# Altium footprint library misc.PcbLib: 60 footprints (part 4 of 4)
Each footprint in its own frame and in the unit in brackets; x right, y up, seen from the top. Pads: shape width x height; smd on the part's side, far side on the other; paste and mask are expansions set on the pad; w line width, h text height; cw(c..) or ccw(c..) is an arc to the next point about the centre after c.
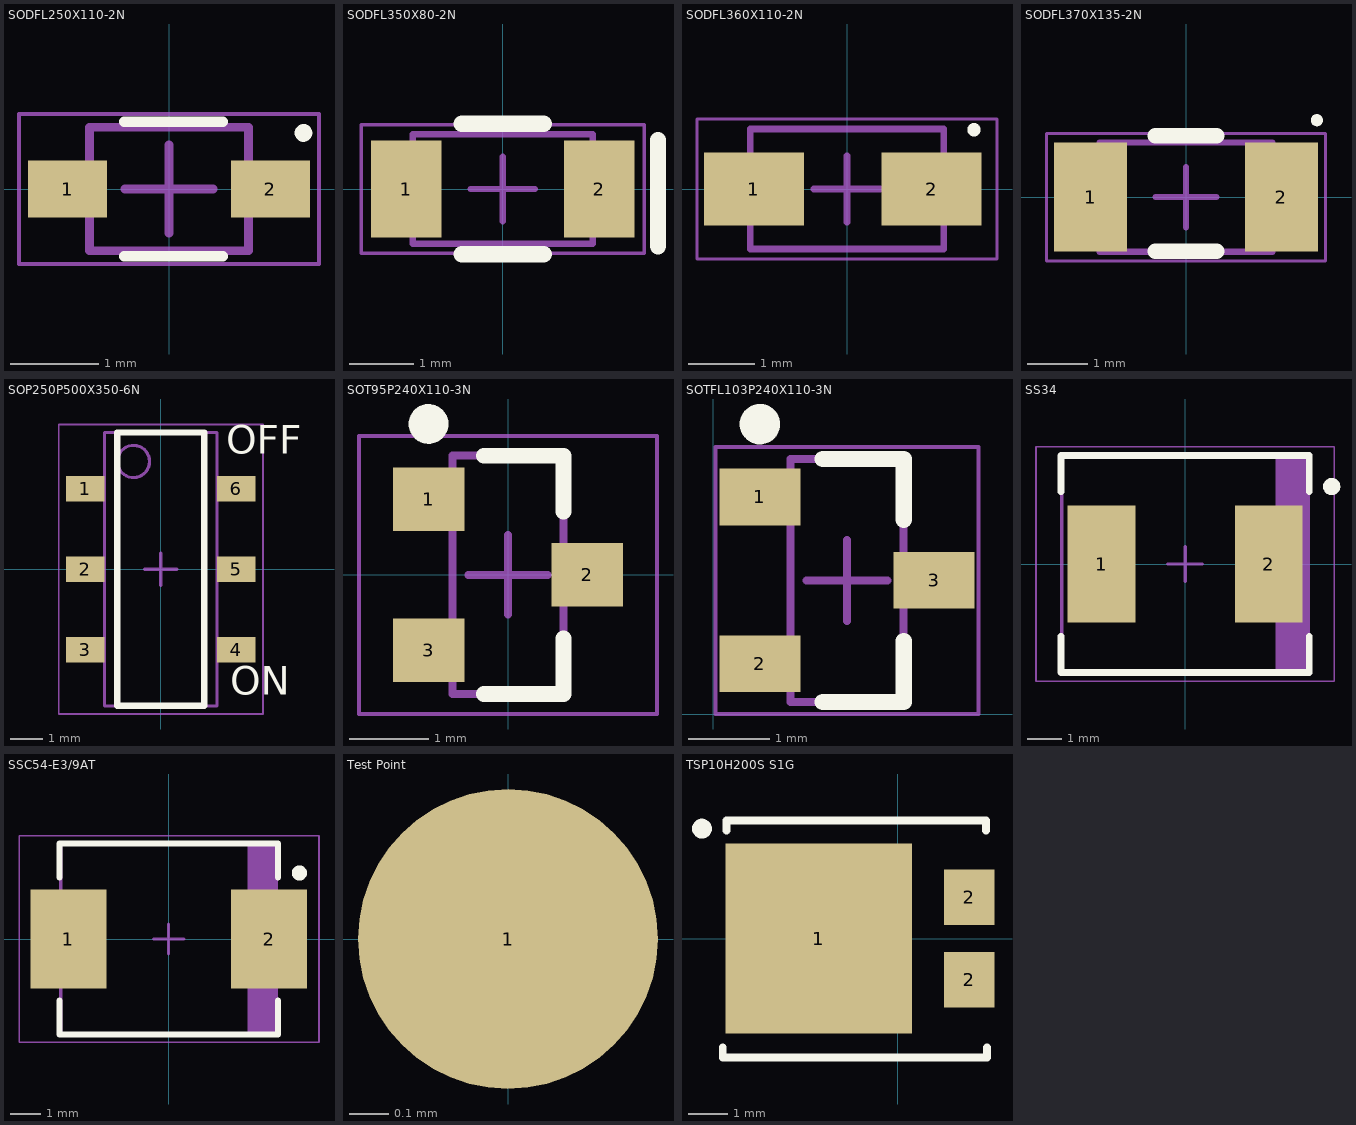
[diagram p3: the footprints below, top view; thin cyan lines are the x and y axes]

## SODFL250X110-2N [mm] "SODFL, 2-Leads, Body 1.30x2.50mm, IPC Medium Density"
height 1.1
pads (2):
  rect 0.9x0.65 smd: 1(-1.15,0) 2(1.15,0)
Top Overlay:
  circle w0.1: c1.524,0.635 r0.05
  lines w0.12: -0.508,-0.762 0.61,-0.762 ; -0.508,0.762 0.61,0.762
Mechanical 13:
  lines w0.1: -0.9,-0.7 0.9,-0.7 0.9,0.7 -0.9,0.7 -0.9,-0.7
Mechanical 15:
  lines w0.05: -1.7,-0.85 1.7,-0.85 1.7,0.85 -1.7,0.85 -1.7,-0.85
  lines w0.1: -0.5,0 0.5,0 ; 0,-0.5 0,0.5
3D body "SODFL250X110-2N.step": height 1.1, standoff 0, extent -1.25,-0.7 1.25,0.7

## SODFL350X80-2N [mm] "SODFL, 2-Leads, Body 1.60x3.50mm, IPC Medium Density"
height 0.8
pads (2):
  rect 1.1x1.5 smd: 1(-1.5,0) 2(1.5,0)
Top Overlay:
  lines w0.254: -0.635,-1.016 0.635,-1.016 ; -0.635,1.016 0.635,1.016 ; 2.413,-0.889 2.413,0.762
Mechanical 13:
  lines w0.1: -1.4,-0.85 -1.4,0.85 1.4,0.85 1.4,-0.85 -1.4,-0.85
Mechanical 15:
  lines w0.05: -2.2,-1 -2.2,1 2.2,1 2.2,-1 -2.2,-1
  lines w0.1: -0.5,0 0.5,0 ; 0,-0.5 0,0.5
3D body: height 0.8, standoff 0, extent -1.4,-0.85 1.4,0.85

## SODFL360X110-2N [mm] "SODFL, 2-Leads, Body 1.65x3.60mm, IPC Medium Density"
height 1.1
pads (2):
  rect 1.5x1.1 smd: 1(-1.397,0) 2(1.27,0)
Top Overlay:
  circle w0.1: c1.905,0.889 r0.05
Mechanical 13:
  lines w0.1: -1.45,-0.9 -1.45,0.9 1.45,0.9 1.45,-0.9 -1.45,-0.9
Mechanical 15:
  lines w0.05: -2.25,-1.05 -2.25,1.05 2.25,1.05 2.25,-1.05 -2.25,-1.05
  lines w0.1: -0.5,0 0.5,0 ; 0,-0.5 0,0.5
3D body "SODFL360X110-2N.step": height 1.1, standoff 0, extent -1.8,-0.9 1.8,0.9

## SODFL370X135-2N [mm] "SODFL, 2-Leads, Body 1.60x3.70mm, IPC Medium Density"
height 1.35
pads (2):
  rect 1.2x1.8 smd: 1(-1.575,0) 2(1.575,0)
Top Overlay:
  circle w0.1: c2.159,1.27 r0.05
  lines w0.254: -0.508,-0.889 0.508,-0.889 ; -0.508,1.016 0.508,1.016
Mechanical 13:
  lines w0.1: -1.425,-0.9 -1.425,0.9 1.425,0.9 1.425,-0.9 -1.425,-0.9
Mechanical 15:
  lines w0.05: -2.3,-1.05 -2.3,1.05 2.3,1.05 2.3,-1.05 -2.3,-1.05
  lines w0.1: -0.5,0 0.5,0 ; 0,-0.5 0,0.5
3D body: height 1.35, standoff 0, extent -1.425,-0.9 1.425,0.9

## SOP250P500X350-6N [mm] "SOP, 6-Leads, Body 8.50x3.50mm, Pitch 2.50mm, IPC Medium Density"
height 3.5
pads (6):
  rect 1.2x0.8 smd: 1(-2.35,2.5) 2(-2.35,0) 3(-2.35,-2.5) 4(2.35,-2.5) 5(2.35,0) 6(2.35,2.5)
Top Overlay:
  lines w0.2: -1.35,-4.25 -1.35,4.25 1.35,4.25 1.35,-4.25 -1.35,-4.25
  text "ON" at 2.159,-4.191 h1.52
  text "OFF" at 2.032,3.302 h1.52
Mechanical 13:
  circle w0.1: c-0.85,3.35 r0.5
  lines w0.1: -1.75,-4.25 -1.75,4.25 1.75,4.25 1.75,-4.25 -1.75,-4.25
Mechanical 15:
  lines w0.05: -3.175,-4.5 -3.175,4.5 3.175,4.5 3.175,-4.5 -3.175,-4.5
  lines w0.1: -0.5,0 0.5,0 ; 0,-0.5 0,0.5
3D body "CL-SB-22B-01T.stp": height 5.5, standoff 0, extent -2.5,-4.25 2.5,4.25

## SOT95P240X110-3N [mm] "SOT23, 3-Leads, Body 2.90x2.40mm, Pitch 0.95mm, IPC Medium Density"
height 1.1
pads (3):
  rect 0.9x0.8 smd: 1(-1,0.95) 2(1,0) 3(-1,-0.95)
Top Overlay:
  circle w0.25: c-1,1.9 r0.125
  lines w0.2: -0.3,-1.5 0.7,-1.5 0.7,-0.8 ; -0.3,1.5 0.7,1.5 0.7,0.8
Mechanical 13:
  lines w0.1: -0.7,-1.5 -0.7,1.5 0.7,1.5 0.7,-1.5 -0.7,-1.5
Mechanical 15:
  lines w0.05: -1.875,-1.75 -1.875,1.75 1.875,1.75 1.875,-1.75 -1.875,-1.75
  lines w0.1: -0.5,0 0.5,0 ; 0,-0.5 0,0.5
3D body: height 1.1, standoff 0.05, extent -0.7,-1.5 0.7,1.5

## SOTFL103P240X110-3N [mm]
pads (3):
  rect 1x0.7 smd: 1(0.576,2.681) 2(0.576,0.621) 3(2.726,1.651)
Top Overlay:
  circle w0.25: c0.576,3.581 r0.125
  lines w0.2: 1.351,0.151 2.351,0.151 2.351,0.901 ; 1.351,3.151 2.351,3.151 2.351,2.401
Mechanical 13:
  lines w0.1: 0.951,0.151 2.351,0.151 2.351,3.151 0.951,3.151 0.951,0.151
Mechanical 15:
  lines w0.05: 0.026,0.001 3.276,0.001 3.276,3.301 0.026,3.301 0.026,0.001
  lines w0.1: 1.151,1.651 2.151,1.651 ; 1.651,1.151 1.651,2.151
3D body "SOTFL103P240X110-3N.step": height 1.1, standoff 0, extent 0.451,0.153 2.851,3.149

## SS34 [mm]
height 2.65
pads (2):
  rect 1.96x3.39 smd: 1(-2.425,0) 2(2.425,0)
Top Overlay:
  circle w0.25: c4.25,2.245 r0.125
  lines w0.2: -3.6,-2.095 -3.6,-3.15 3.6,-3.15 3.6,-2.095 ; -3.6,2.095 -3.6,3.15 3.6,3.15 3.6,2.095
Top Assembly:
  rectangle: 2.613,-3.125 3.575,3.125
  lines w0.1: -3.575,-3.125 3.575,-3.125 3.575,3.125 -3.575,3.125 -3.575,-3.125
Mechanical 15:
  lines w0.05: -4.325,-3.4 4.325,-3.4 4.325,3.4 -4.325,3.4 -4.325,-3.4
  lines w0.1: -0.5,0 0.5,0 ; 0,-0.5 0,0.5
3D body "SS34.step": height 2.65, standoff 0, extent -3.795,-3.125 3.795,3.125

## SSC54-E3/9AT [mm] "Molded Diode, 2-Leads, Body 6.86x5.91mm, IPC Medium Density"
height 2.62
pads (2):
  rect 2.5x3.25 smd: 1(-3.305,0) 2(3.305,0)
Top Overlay:
  circle w0.25: c4.305,2.175 r0.125
  lines w0.2: -3.6,-2.025 -3.6,-3.15 3.6,-3.15 3.6,-2.025 ; -3.6,2.025 -3.6,3.15 3.6,3.15 3.6,2.025
Top Assembly:
  rectangle: 2.599,-3.11 3.555,3.11
  lines w0.1: -3.555,-3.11 -3.555,3.11 3.555,3.11 3.555,-3.11 -3.555,-3.11
Mechanical 15:
  lines w0.05: -4.925,-3.4 4.95,-3.4 4.95,3.4 -4.925,3.4 -4.925,-3.4
  lines w0.1: -0.5,0 0.5,0 ; 0,-0.5 0,0.5
3D body: height 2.62, standoff 0, extent -3.555,-3.11 3.555,3.11

## STL90N6F7 [mm]

## Test Point [mil] "SMD Test Point"
pads (1):
  round 30 smd: 1(0,0)

## TSP10H200S S1G [mm] "Molded Diode, 2-Leads, Body 4.30x2.61mm, IPC Medium Density"
height 1.96
pads (3):
  rect 4.72x4.8 smd: 1(-2,0)
  rect 1.27x1.4 smd: 2(1.8,-1.04) 2(1.8,1.04)
Top Overlay:
  circle w0.25: c-4.95,2.775 r0.125
  lines w0.2: -4.425,-2.75 -4.425,-3 2.25,-3 2.25,-2.75 ; -4.325,2.725 -4.325,2.975 2.225,2.975 2.225,2.725
3D body "TSP10H200S.STEP": height 1.2, standoff 0, extent -4.15,-2.201 2.35,2.401